# Altium integrated library TI Power Management Battery Management.IntLib: 950 symbols (part 35 of 48)
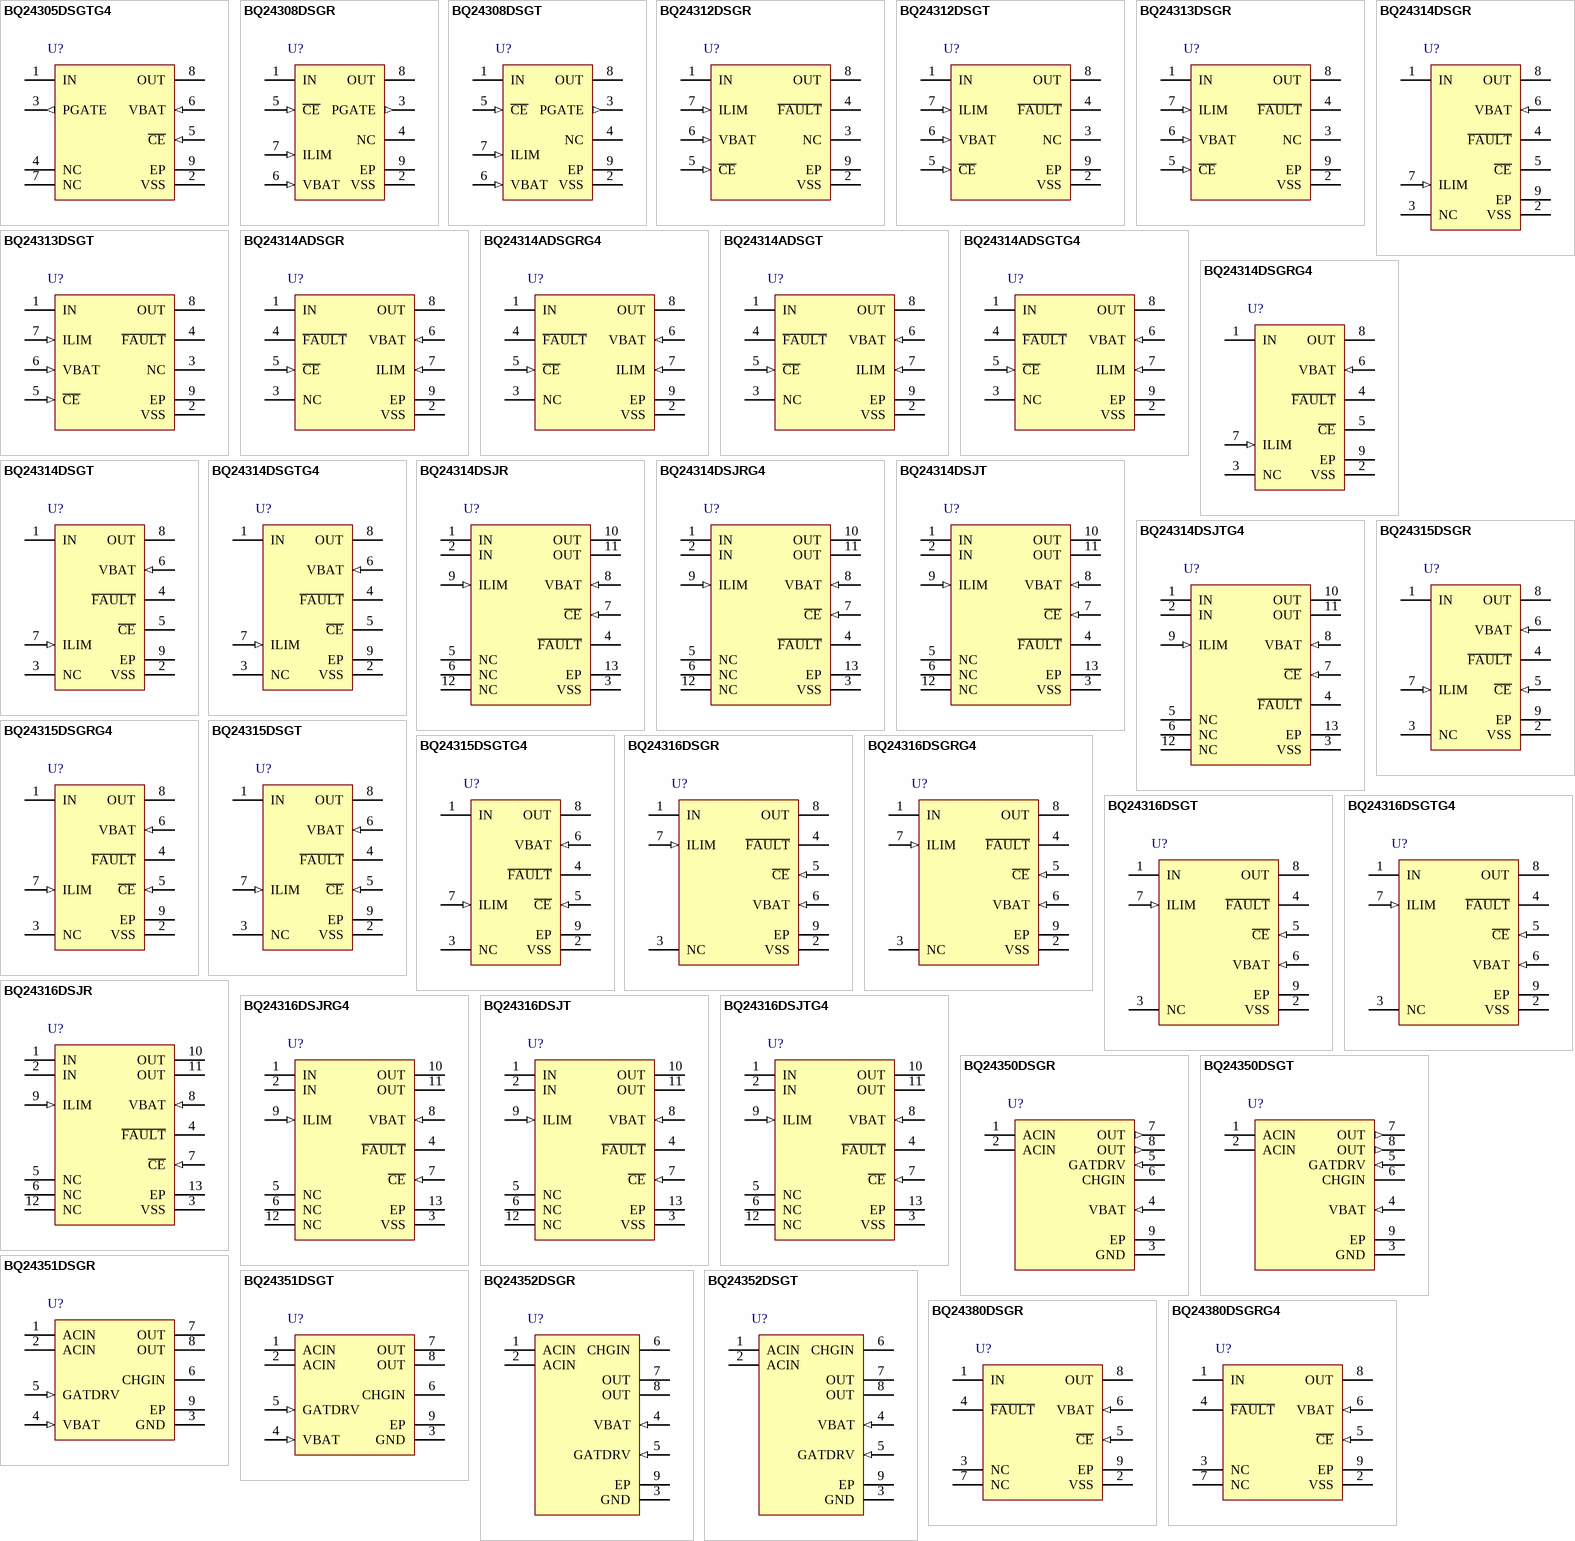
[diagram p68: symbols BQ24305DSGTG4 to BQ24380DSGRG4]

## BQ24316DSJT
designator U?
Charger Front End Protection IC with 30 V Max Vin and 6.8 V OVP, -40 to 85 degC, 12-pin VSON (DSJ), Green (RoHS & no Sb/Br); PartNumber: BQ24316DSJT; Manufacturer: Texas Instruments; Lead Acid: N; DatasheetVersion: SLUS763C; PackageVersion: revC, Jun-2011; PackageReference: DSJ12-3300X1700TP; PackageDescription: 12-Pin Plastic Small Outline No-Lead, 3 x 4 x 1 mm Body, 0.5 mm Pitch, Exposed Pad; Supplier 1: Digi-Key; Supplier Part Number 1: BQ24316DSJT-ND; Supplier Part Number 3: 595-BQ24316DSJT; Eco-Plan: Green (RoHS & no Sb/Br); Li-Ion: N; Li-Polymer: N; NiCd: N; NiMH: N; Over Voltage Protection: N; SubFamily: Charger Front End Protection; Mounting Technology: Surface Mount; Code_JEDEC: MO-229; ComponentLink1Description: Datasheet; ComponentLink1URL: http://www.ti.com/general/docs/lit/getliterature.tsp?genericPartNumber=BQ24316&fileType=pdf
footprint DSJ12-3300X1700TP (SON, 12-Leads, Body 3x4mm, Pitch 0.5mm, Thermal Pad 3.3x1.7mm)
pins: 1 IN (power) "Input power, connect to external DC supply. Connect external 1uF ceramic capacitor (minimum) to VSS. For the 12 pin (DSJ-suffix) device, ensure that pins 1 and 2 are connected together on the PCB at the device.", 2 IN (power) "Input power, connect to external DC supply. Connect external 1uF ceramic capacitor (minimum) to VSS. For the 12 pin (DSJ-suffix) device, ensure that pins 1 and 2 are connected together on the PCB at the device.", 3 VSS (power) "Ground terminal", 4 ~{FAULT} (hiz) "Open-drain output, device status. F\A\U\L\T\ = Low indicates that the input FET Q1 has been turned off due to input overvoltage, input overcurrent, battery overvoltage, or thermal shutdown.", 5 NC "These pins may have internal circuits used for test purposes. Do not make any external connections at these pins for normal operation.", 6 NC "These pins may have internal circuits used for test purposes. Do not make any external connections at these pins for normal operation.", 7 ~{CE} (in) "Chip enable input. Active low. When C\E\ = High, the input FET is off. Internally pulled down.", 8 VBAT (in) "Battery voltage sense input. Connect to pack positive terminal through a resistor.", 9 ILIM (in) "Input overcurrent threshold programming. Connect a resistor to VSS to set the overcurrent threshold.", 10 OUT (power) "Output terminal to the charging system. Connect external 1uF ceramic capacitor (minimum) to VSS.", 11 OUT (power) "Output terminal to the charging system. Connect external 1uF ceramic capacitor (minimum) to VSS.", 12 NC "These pins may have internal circuits used for test purposes. Do not make any external connections at these pins for normal operation.", 13 EP (power) "There is an internal electrical connection between the exposed thermal pad and the VSS pin of the device. The thermal pad must be connected to the same potential as the VSS pin on the printed circuit board. Do not use the (See Datasheet)"

## BQ24316DSJTG4
designator U?
Charger Front End Protection IC with 30 V Max Vin and 6.8 V OVP, -40 to 85 degC, 12-pin VSON (DSJ), Green (RoHS & no Sb/Br); PartNumber: BQ24316DSJTG4; Manufacturer: Texas Instruments; Lead Acid: N; DatasheetVersion: SLUS763C; PackageVersion: revC, Jun-2011; PackageReference: DSJ12-3300X1700TP; PackageDescription: 12-Pin Plastic Small Outline No-Lead, 3 x 4 x 1 mm Body, 0.5 mm Pitch, Exposed Pad; Supplier 1: Digi-Key; Supplier Part Number 1: BQ24316DSJTG4-ND; Eco-Plan: Green (RoHS & no Sb/Br); Li-Ion: N; Li-Polymer: N; NiCd: N; NiMH: N; Over Voltage Protection: N; SubFamily: Charger Front End Protection; Mounting Technology: Surface Mount; Code_JEDEC: MO-229; ComponentLink1Description: Datasheet; ComponentLink1URL: http://www.ti.com/general/docs/lit/getliterature.tsp?genericPartNumber=BQ24316&fileType=pdf
footprint DSJ12-3300X1700TP (SON, 12-Leads, Body 3x4mm, Pitch 0.5mm, Thermal Pad 3.3x1.7mm)
pins: 1 IN (power) "Input power, connect to external DC supply. Connect external 1uF ceramic capacitor (minimum) to VSS. For the 12 pin (DSJ-suffix) device, ensure that pins 1 and 2 are connected together on the PCB at the device.", 2 IN (power) "Input power, connect to external DC supply. Connect external 1uF ceramic capacitor (minimum) to VSS. For the 12 pin (DSJ-suffix) device, ensure that pins 1 and 2 are connected together on the PCB at the device.", 3 VSS (power) "Ground terminal", 4 ~{FAULT} (hiz) "Open-drain output, device status. F\A\U\L\T\ = Low indicates that the input FET Q1 has been turned off due to input overvoltage, input overcurrent, battery overvoltage, or thermal shutdown.", 5 NC "These pins may have internal circuits used for test purposes. Do not make any external connections at these pins for normal operation.", 6 NC "These pins may have internal circuits used for test purposes. Do not make any external connections at these pins for normal operation.", 7 ~{CE} (in) "Chip enable input. Active low. When C\E\ = High, the input FET is off. Internally pulled down.", 8 VBAT (in) "Battery voltage sense input. Connect to pack positive terminal through a resistor.", 9 ILIM (in) "Input overcurrent threshold programming. Connect a resistor to VSS to set the overcurrent threshold.", 10 OUT (power) "Output terminal to the charging system. Connect external 1uF ceramic capacitor (minimum) to VSS.", 11 OUT (power) "Output terminal to the charging system. Connect external 1uF ceramic capacitor (minimum) to VSS.", 12 NC "These pins may have internal circuits used for test purposes. Do not make any external connections at these pins for normal operation.", 13 EP (power) "There is an internal electrical connection between the exposed thermal pad and the VSS pin of the device. The thermal pad must be connected to the same potential as the VSS pin on the printed circuit board. Do not use the (See Datasheet)"

## BQ24350DSGR
designator U?
Over-Voltage and Over-Current Charger Front-End Protection IC with FET, 6.17 Input OVP, -40 to 85 degC, 8-pin WSON (DSG), Green (RoHS & no Sb/Br); PartNumber: BQ24350DSGR; Manufacturer: Texas Instruments; Lead Acid: N; SubFamily: Charger Front End Protection; DatasheetVersion: SLUS943A; PackageVersion: revB, Oct-2010; PackageReference: DSG8-1600X900TP; PackageDescription: 8-Pin Plastic Small Outline No-Lead, 2 x 2 x 0.8 mm Body, 0.5 mm Pitch, Exposed Pad; Supplier 1: Digi-Key; Supplier Part Number 1: 296-24528-2-ND; Supplier Part Number 3: 296-24528-6-ND; Eco-Plan: Green (RoHS & no Sb/Br); Li-Ion: N; Li-Polymer: N; NiCd: N; NiMH: N; Over Voltage Protection: N; Mounting Technology: Surface Mount; Code_JEDEC: MO-229; ComponentLink1Description: Datasheet; ComponentLink1URL: http://www.ti.com/general/docs/lit/getliterature.tsp?genericPartNumber=BQ24350&fileType=pdf
footprint DSG8-1600X900TP (SON, 8-Leads, Body 2x2mm, Pitch 0.5mm, Thermal Pad 1.6x0.9mm, TI Recommended)
pins: 1 ACIN (power) "Power Supply Input, connect to an external DC supply. Connect an external 1uF ceramic capacitor (minimum) to GND.", 2 ACIN (power) "Power Supply Input, connect to an external DC supply. Connect an external 1uF ceramic capacitor (minimum) to GND.", 3 GND (power) "Ground terminal", 4 VBAT (in) "Battery voltage sense input. Connected to pack positive terminal through a resistor. Connected to ground if battery OVP function is not used.", 5 GATDRV (in) "P-FET gate drive input , connected to gate drive pin of the host charger controller", 6 CHGIN (power) "Output power pin for power input of host charger controller. Connect an external ceramic bypass capacitor (1.0uF minimum) to GND.", 7 OUT (out) "Output terminal to the charging system.", 8 OUT (out) "Output terminal to the charging system.", 9 EP (power) "There is an internal electrical connection between the exposed thermal pad and the GND pin of the device. The thermal pad must be connected to the same potential as the GND pin on the printed circuit board. Do not use the (See Datasheet)"

## BQ24350DSGT
designator U?
Over-Voltage and Over-Current Charger Front-End Protection IC with FET, 6.17 Input OVP, -40 to 85 degC, 8-pin WSON (DSG), Green (RoHS & no Sb/Br); PartNumber: BQ24350DSGT; Manufacturer: Texas Instruments; Lead Acid: N; SubFamily: Charger Front End Protection; DatasheetVersion: SLUS943A; PackageVersion: revB, Oct-2010; PackageReference: DSG8-1600X900TP; PackageDescription: 8-Pin Plastic Small Outline No-Lead, 2 x 2 x 0.8 mm Body, 0.5 mm Pitch, Exposed Pad; Supplier 1: Digi-Key; Supplier Part Number 1: BQ24350DSGT-ND; Supplier Part Number 3: 595-BQ24350DSGT; Eco-Plan: Green (RoHS & no Sb/Br); Li-Ion: N; Li-Polymer: N; NiCd: N; NiMH: N; Over Voltage Protection: N; Mounting Technology: Surface Mount; Code_JEDEC: MO-229; ComponentLink1Description: Datasheet; ComponentLink1URL: http://www.ti.com/general/docs/lit/getliterature.tsp?genericPartNumber=BQ24350&fileType=pdf
footprint DSG8-1600X900TP (SON, 8-Leads, Body 2x2mm, Pitch 0.5mm, Thermal Pad 1.6x0.9mm, TI Recommended)
pins: 1 ACIN (power) "Power Supply Input, connect to an external DC supply. Connect an external 1uF ceramic capacitor (minimum) to GND.", 2 ACIN (power) "Power Supply Input, connect to an external DC supply. Connect an external 1uF ceramic capacitor (minimum) to GND.", 3 GND (power) "Ground terminal", 4 VBAT (in) "Battery voltage sense input. Connected to pack positive terminal through a resistor. Connected to ground if battery OVP function is not used.", 5 GATDRV (in) "P-FET gate drive input , connected to gate drive pin of the host charger controller", 6 CHGIN (power) "Output power pin for power input of host charger controller. Connect an external ceramic bypass capacitor (1.0uF minimum) to GND.", 7 OUT (out) "Output terminal to the charging system.", 8 OUT (out) "Output terminal to the charging system.", 9 EP (power) "There is an internal electrical connection between the exposed thermal pad and the GND pin of the device. The thermal pad must be connected to the same potential as the GND pin on the printed circuit board. Do not use the (See Datasheet)"

## BQ24351DSGR
designator U?
Over Voltage and Over-Current Charger Front-End Protection IC with Integrated Charging FET, -40 to 85 degC, 8-pin WSON (DSG), Green (RoHS & no Sb/Br); PartNumber: BQ24351DSGR; Manufacturer: Texas Instruments; Lead Acid: N; Over Voltage Protection: Y; SubFamily: Charger Front End Protection; DatasheetVersion: SLUSA62A; PackageVersion: revB, Oct-2010; PackageReference: DSG8-1600X900TP; PackageDescription: 8-Pin Plastic Small Outline No-Lead, 2 x 2 x 0.8 mm Body, 0.5 mm Pitch, Exposed Pad; Supplier 1: Digi-Key; Supplier Part Number 1: BQ24351DSGR-ND; Eco-Plan: Green (RoHS & no Sb/Br); Li-Ion: N; Li-Polymer: N; NiCd: N; NiMH: N; Mounting Technology: Surface Mount; Code_JEDEC: MO-229; ComponentLink1Description: Datasheet; ComponentLink1URL: http://www.ti.com/general/docs/lit/getliterature.tsp?genericPartNumber=BQ24351&fileType=pdf
footprint DSG8-1600X900TP (SON, 8-Leads, Body 2x2mm, Pitch 0.5mm, Thermal Pad 1.6x0.9mm, TI Recommended)
pins: 1 ACIN (power) "Power Supply Input, connect to an external DC supply. Connect an external 1-uF ceramic capacitor (minimum) to GND.", 2 ACIN (power) "Power Supply Input, connect to an external DC supply. Connect an external 1-uF ceramic capacitor (minimum) to GND.", 3 GND (power) "Ground terminal", 4 VBAT (in) "Battery voltage sense input. Connected to pack positive terminal through a resistor. Connected to ground if battery OVP function is not used.", 5 GATDRV (in) "P-FET gate drive input , connected to gate drive pin of the host charger controller", 6 CHGIN (power) "Output power pin for power input of host charger controller. Connect an external ceramic bypass capacitor (1.0-uF minimum) to GND.", 7 OUT (power) "Output terminal to the charging system.", 8 OUT (power) "Output terminal to the charging system.", 9 EP (power) "There is an internal electrical connection between the exposed thermal pad and the GND pin of the device. The thermal pad must be connected to the same potential as the GND pin on the printed circuit board. Do not use the (See Datasheet)"

## BQ24351DSGT
designator U?
Over-Voltage and Over-Current Charger Front-End Protection IC with Integrated Charging FET, -40 to 85 degC, 8-pin WSON (DSG), Green (RoHS & no Sb/Br); PartNumber: BQ24351DSGT; Manufacturer: Texas Instruments; Lead Acid: N; Over Voltage Protection: Y; SubFamily: Charger Front End Protection; DatasheetVersion: SLUSA62A; PackageVersion: revB, Oct-2010; PackageReference: DSG8-1600X900TP; PackageDescription: 8-Pin Plastic Small Outline No-Lead, 2 x 2 x 0.8 mm Body, 0.5 mm Pitch, Exposed Pad; Supplier 1: Digi-Key; Supplier Part Number 1: 296-27913-2-ND; Supplier Part Number 3: 296-27913-6-ND; Eco-Plan: Green (RoHS & no Sb/Br); Li-Ion: N; Li-Polymer: N; NiCd: N; NiMH: N; Mounting Technology: Surface Mount; Code_JEDEC: MO-229; ComponentLink1Description: Datasheet; ComponentLink1URL: http://www.ti.com/general/docs/lit/getliterature.tsp?genericPartNumber=BQ24351&fileType=pdf
footprint DSG8-1600X900TP (SON, 8-Leads, Body 2x2mm, Pitch 0.5mm, Thermal Pad 1.6x0.9mm, TI Recommended)
pins: 1 ACIN (power) "Power Supply Input, connect to an external DC supply. Connect an external 1-uF ceramic capacitor (minimum) to GND.", 2 ACIN (power) "Power Supply Input, connect to an external DC supply. Connect an external 1-uF ceramic capacitor (minimum) to GND.", 3 GND (power) "Ground terminal", 4 VBAT (in) "Battery voltage sense input. Connected to pack positive terminal through a resistor. Connected to ground if battery OVP function is not used.", 5 GATDRV (in) "P-FET gate drive input , connected to gate drive pin of the host charger controller", 6 CHGIN (power) "Output power pin for power input of host charger controller. Connect an external ceramic bypass capacitor (1.0-uF minimum) to GND.", 7 OUT (power) "Output terminal to the charging system.", 8 OUT (power) "Output terminal to the charging system.", 9 EP (power) "There is an internal electrical connection between the exposed thermal pad and the GND pin of the device. The thermal pad must be connected to the same potential as the GND pin on the printed circuit board. Do not use the (See Datasheet)"

## BQ24352DSGR
designator U?
Over Voltage and Over-Current Charger Front-End Protection IC with FET, 7.1 Input OVP, -40 to 85 degC, 8-pin WSON (DSG), Green (RoHS & no Sb/Br); PartNumber: BQ24352DSGR; Manufacturer: Texas Instruments; Lead Acid: N; SubFamily: Charger Front End Protection; DatasheetVersion: SLUS943A; PackageVersion: revB, Oct-2010; PackageReference: DSG8-1600X900TP; PackageDescription: 8-Pin Plastic Small Outline No-Lead, 2 x 2 x 0.8 mm Body, 0.5 mm Pitch, Exposed Pad; Supplier 1: Digi-Key; Supplier Part Number 1: 296-24859-2-ND; Supplier Part Number 3: 296-24859-6-ND; Eco-Plan: Green (RoHS & no Sb/Br); Li-Ion: N; Li-Polymer: N; NiCd: N; NiMH: N; Over Voltage Protection: N; Mounting Technology: Surface Mount; Code_JEDEC: MO-229; ComponentLink1Description: Datasheet; ComponentLink1URL: http://www.ti.com/general/docs/lit/getliterature.tsp?genericPartNumber=BQ24352&fileType=pdf
footprint DSG8-1600X900TP (SON, 8-Leads, Body 2x2mm, Pitch 0.5mm, Thermal Pad 1.6x0.9mm, TI Recommended)
pins: 1 ACIN (power) "Power Supply Input, connect to an external DC supply. Connect an external 1 uF ceramic capacitor (minimum) to GND.", 2 ACIN (power) "Power Supply Input, connect to an external DC supply. Connect an external 1 uF ceramic capacitor (minimum) to GND.", 3 GND (power) "Ground terminal.", 4 VBAT (in) "Battery voltage sense input. Connected to pack positive terminal through a resistor. Connected to ground if battery OVP function is not used.", 5 GATDRV (in) "P-FET gate drive input , connected to gate drive pin of the host charger controller.", 6 CHGIN (power) "Output power pin for power input of host charger controller. Connect an external ceramic bypass capacitor (1.0 uF minimum) to GND.", 7 OUT (power) "Output terminal to the charging system.", 8 OUT (power) "Output terminal to the charging system.", 9 EP (power) "There is an internal electrical connection between the exposed thermal pad and the GND pin of the device. The thermal pad must be connected to the same potential as the GND pin on the printed circuit board. Do not use the (See Datasheet)"

## BQ24352DSGT
designator U?
Over Voltage and Over-Current Charger Front-End Protection IC with FET, 7.1 Input OVP, -40 to 85 degC, 8-pin WSON (DSG), Green (RoHS & no Sb/Br); PartNumber: BQ24352DSGT; Manufacturer: Texas Instruments; Lead Acid: N; SubFamily: Charger Front End Protection; DatasheetVersion: SLUS943A; PackageVersion: revB, Oct-2010; PackageReference: DSG8-1600X900TP; PackageDescription: 8-Pin Plastic Small Outline No-Lead, 2 x 2 x 0.8 mm Body, 0.5 mm Pitch, Exposed Pad; Supplier 1: Digi-Key; Supplier Part Number 1: BQ24352DSGT-ND; Eco-Plan: Green (RoHS & no Sb/Br); Li-Ion: N; Li-Polymer: N; NiCd: N; NiMH: N; Over Voltage Protection: N; Mounting Technology: Surface Mount; Code_JEDEC: MO-229; ComponentLink1Description: Datasheet; ComponentLink1URL: http://www.ti.com/general/docs/lit/getliterature.tsp?genericPartNumber=BQ24352&fileType=pdf
footprint DSG8-1600X900TP (SON, 8-Leads, Body 2x2mm, Pitch 0.5mm, Thermal Pad 1.6x0.9mm, TI Recommended)
pins: 1 ACIN (power) "Power Supply Input, connect to an external DC supply. Connect an external 1 uF ceramic capacitor (minimum) to GND.", 2 ACIN (power) "Power Supply Input, connect to an external DC supply. Connect an external 1 uF ceramic capacitor (minimum) to GND.", 3 GND (power) "Ground terminal.", 4 VBAT (in) "Battery voltage sense input. Connected to pack positive terminal through a resistor. Connected to ground if battery OVP function is not used.", 5 GATDRV (in) "P-FET gate drive input , connected to gate drive pin of the host charger controller.", 6 CHGIN (power) "Output power pin for power input of host charger controller. Connect an external ceramic bypass capacitor (1.0 uF minimum) to GND.", 7 OUT (power) "Output terminal to the charging system.", 8 OUT (power) "Output terminal to the charging system.", 9 EP (power) "There is an internal electrical connection between the exposed thermal pad and the GND pin of the device. The thermal pad must be connected to the same potential as the GND pin on the printed circuit board. Do not use the (See Datasheet)"

## BQ24380DSGR
designator U?
Overvoltage / Overcurrent Protection IC and Li+ Charger Front End Protection IC with LDO Mode, 6.3 OVP, -40 to 125 degC, 8-pin WSON (DSG), Green (RoHS & no Sb/Br); PartNumber: BQ24380DSGR; Manufacturer: Texas Instruments; Lead Acid: N; DatasheetVersion: SLUS805B; PackageVersion: revB, Oct-2010; PackageReference: DSG8-1600X900TP; PackageDescription: 8-Pin Plastic Small Outline No-Lead, 2 x 2 x 0.8 mm Body, 0.5 mm Pitch, Exposed Pad; Supplier 1: Digi-Key; Supplier Part Number 1: 296-23385-2-ND; Supplier Part Number 3: 296-23385-6-ND; Eco-Plan: Green (RoHS & no Sb/Br); Li-Ion: N; Li-Polymer: N; NiCd: N; NiMH: N; Over Voltage Protection: N; SubFamily: Charger Front End Protection; Mounting Technology: Surface Mount; Code_JEDEC: MO-229; ComponentLink1Description: Datasheet; ComponentLink1URL: http://www.ti.com/general/docs/lit/getliterature.tsp?genericPartNumber=BQ24380&fileType=pdf
footprint DSG8-1600X900TP (SON, 8-Leads, Body 2x2mm, Pitch 0.5mm, Thermal Pad 1.6x0.9mm, TI Recommended)
pins: 1 IN (power) "Input power, connected to external DC supply. Bypass IN to VSS with a ceramic capacitor (1 uF minimum)", 2 VSS (power) "Ground terminal. Connect to the thermal pad and to the ground rail of the circuit", 3 NC "Do not connect to any external circuits. These pins may have internal connections used for test purposes.", 4 ~{FAULT} (hiz) "Open-drain device status output. F\A\U\L\T\ is pulled to VSS internally when the input pass FET has been turned off due to input overvoltage or output short-circuit conditions, an overtemperature condition, or because the (See Datasheet)", 5 ~{CE} (in) "Active-low chip enable input. Connect C\E\ = HI to turn the input pass FET off. Connect C\E\ = LOW to turn the internal pass FET on and connect the input to the charging circuitry. C\E\ is Internally pulled down, ~200 k ohm.", 6 VBAT (in) "Battery voltage sense input. Connected to pack positive terminal through a 100-k ohm resistor", 7 NC "Do not connect to any external circuits. These pins may have internal connections used for test purposes.", 8 OUT (power) "Output terminal to the charging system. Bypass OUT to VSS with a ceramic capacitor (1 uF minimum)", 9 EP (power) "The thermal pad is electrically connected to VSS internally. The thermal pad must be connected to the same potential as the VSS pin on the printed circuit board. Do not use the thermal pad as the primary ground input for the (See Datasheet)"

## BQ24380DSGRG4
designator U?
Overvoltage / Overcurrent Protection IC and Li+ Charger Front End Protection IC with LDO Mode, 6.3 OVP, -40 to 125 degC, 8-pin WSON (DSG), Green (RoHS & no Sb/Br); PartNumber: BQ24380DSGRG4; Manufacturer: Texas Instruments; Lead Acid: N; DatasheetVersion: SLUS805B; PackageVersion: revB, Oct-2010; PackageReference: DSG8-1600X900TP; PackageDescription: 8-Pin Plastic Small Outline No-Lead, 2 x 2 x 0.8 mm Body, 0.5 mm Pitch, Exposed Pad; Supplier 1: Digi-Key; Supplier Part Number 1: BQ24380DSGRG4-ND; Eco-Plan: Green (RoHS & no Sb/Br); Li-Ion: N; Li-Polymer: N; NiCd: N; NiMH: N; Over Voltage Protection: N; SubFamily: Charger Front End Protection; Mounting Technology: Surface Mount; Code_JEDEC: MO-229; ComponentLink1Description: Datasheet; ComponentLink1URL: http://www.ti.com/general/docs/lit/getliterature.tsp?genericPartNumber=BQ24380&fileType=pdf
footprint DSG8-1600X900TP (SON, 8-Leads, Body 2x2mm, Pitch 0.5mm, Thermal Pad 1.6x0.9mm, TI Recommended)
pins: 1 IN (power) "Input power, connected to external DC supply. Bypass IN to VSS with a ceramic capacitor (1 uF minimum)", 2 VSS (power) "Ground terminal. Connect to the thermal pad and to the ground rail of the circuit", 3 NC "Do not connect to any external circuits. These pins may have internal connections used for test purposes.", 4 ~{FAULT} (hiz) "Open-drain device status output. F\A\U\L\T\ is pulled to VSS internally when the input pass FET has been turned off due to input overvoltage or output short-circuit conditions, an overtemperature condition, or because the (See Datasheet)", 5 ~{CE} (in) "Active-low chip enable input. Connect C\E\ = HI to turn the input pass FET off. Connect C\E\ = LOW to turn the internal pass FET on and connect the input to the charging circuitry. C\E\ is Internally pulled down, ~200 k ohm.", 6 VBAT (in) "Battery voltage sense input. Connected to pack positive terminal through a 100-k ohm resistor", 7 NC "Do not connect to any external circuits. These pins may have internal connections used for test purposes.", 8 OUT (power) "Output terminal to the charging system. Bypass OUT to VSS with a ceramic capacitor (1 uF minimum)", 9 EP (power) "The thermal pad is electrically connected to VSS internally. The thermal pad must be connected to the same potential as the VSS pin on the printed circuit board. Do not use the thermal pad as the primary ground input for the (See Datasheet)"

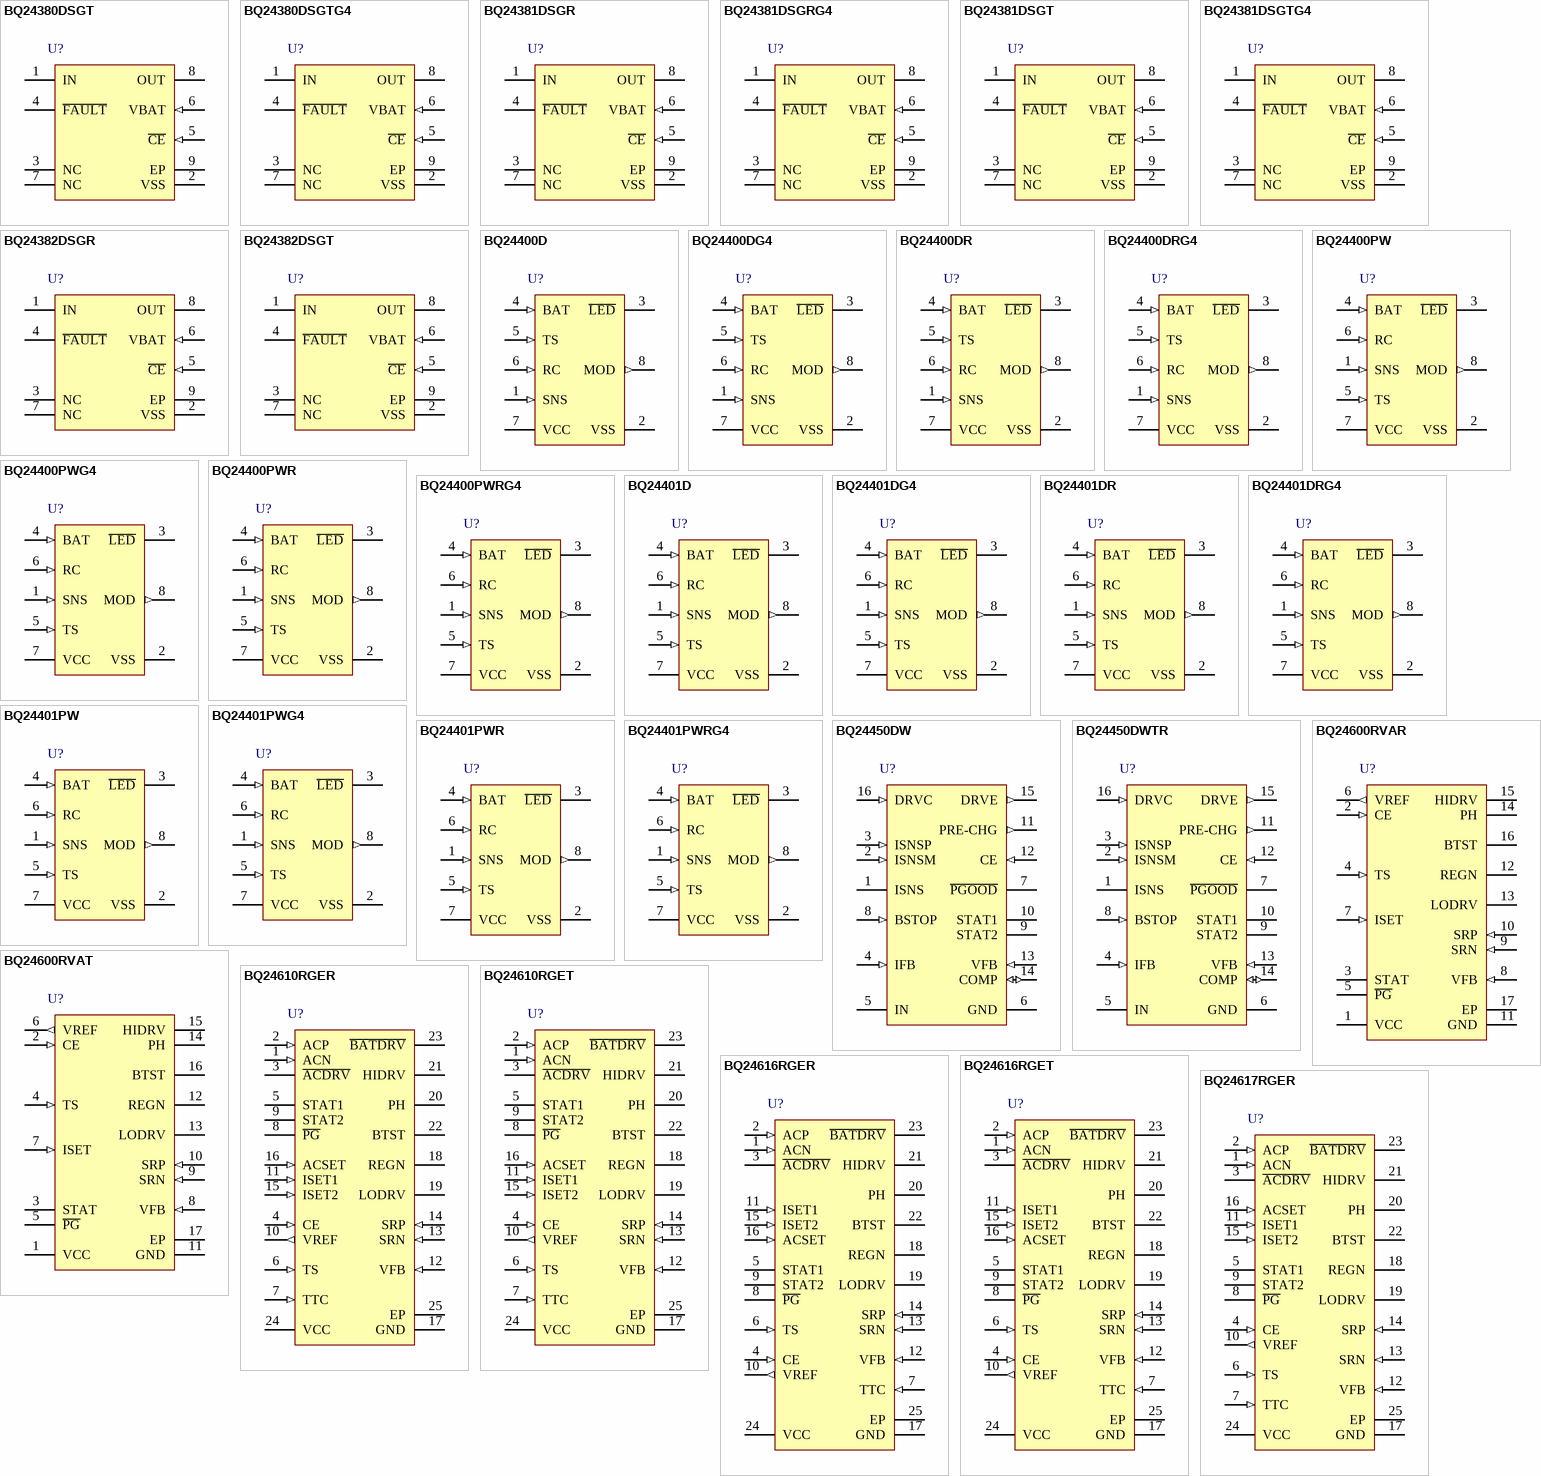
[diagram p24: symbols BQ24380DSGT to BQ24617RGER]

## BQ24380DSGT
designator U?
Overvoltage / Overcurrent Protection IC and Li+ Charger Front End Protection IC with LDO Mode, 6.3 OVP, -40 to 125 degC, 8-pin WSON (DSG), Green (RoHS & no Sb/Br); PartNumber: BQ24380DSGT; Manufacturer: Texas Instruments; Lead Acid: N; DatasheetVersion: SLUS805B; PackageVersion: revB, Oct-2010; PackageReference: DSG8-1600X900TP; PackageDescription: 8-Pin Plastic Small Outline No-Lead, 2 x 2 x 0.8 mm Body, 0.5 mm Pitch, Exposed Pad; Supplier 1: Digi-Key; Supplier Part Number 1: BQ24380DSGT-ND; Eco-Plan: Green (RoHS & no Sb/Br); Li-Ion: N; Li-Polymer: N; NiCd: N; NiMH: N; Over Voltage Protection: N; SubFamily: Charger Front End Protection; Mounting Technology: Surface Mount; Code_JEDEC: MO-229; ComponentLink1Description: Datasheet; ComponentLink1URL: http://www.ti.com/general/docs/lit/getliterature.tsp?genericPartNumber=BQ24380&fileType=pdf
footprint DSG8-1600X900TP (SON, 8-Leads, Body 2x2mm, Pitch 0.5mm, Thermal Pad 1.6x0.9mm, TI Recommended)
pins: 1 IN (power) "Input power, connected to external DC supply. Bypass IN to VSS with a ceramic capacitor (1 uF minimum)", 2 VSS (power) "Ground terminal. Connect to the thermal pad and to the ground rail of the circuit", 3 NC "Do not connect to any external circuits. These pins may have internal connections used for test purposes.", 4 ~{FAULT} (hiz) "Open-drain device status output. F\A\U\L\T\ is pulled to VSS internally when the input pass FET has been turned off due to input overvoltage or output short-circuit conditions, an overtemperature condition, or because the (See Datasheet)", 5 ~{CE} (in) "Active-low chip enable input. Connect C\E\ = HI to turn the input pass FET off. Connect C\E\ = LOW to turn the internal pass FET on and connect the input to the charging circuitry. C\E\ is Internally pulled down, ~200 k ohm.", 6 VBAT (in) "Battery voltage sense input. Connected to pack positive terminal through a 100-k ohm resistor", 7 NC "Do not connect to any external circuits. These pins may have internal connections used for test purposes.", 8 OUT (power) "Output terminal to the charging system. Bypass OUT to VSS with a ceramic capacitor (1 uF minimum)", 9 EP (power) "The thermal pad is electrically connected to VSS internally. The thermal pad must be connected to the same potential as the VSS pin on the printed circuit board. Do not use the thermal pad as the primary ground input for the (See Datasheet)"

## BQ24380DSGTG4
designator U?
Overvoltage / Overcurrent Protection IC and Li+ Charger Front End Protection IC with LDO Mode, 6.3 OVP, -40 to 125 degC, 8-pin WSON (DSG), Green (RoHS & no Sb/Br); PartNumber: BQ24380DSGTG4; Manufacturer: Texas Instruments; Lead Acid: N; DatasheetVersion: SLUS805B; PackageVersion: revB, Oct-2010; PackageReference: DSG8-1600X900TP; PackageDescription: 8-Pin Plastic Small Outline No-Lead, 2 x 2 x 0.8 mm Body, 0.5 mm Pitch, Exposed Pad; Supplier 1: Digi-Key; Supplier Part Number 1: BQ24380DSGTG4-ND; Eco-Plan: Green (RoHS & no Sb/Br); Li-Ion: N; Li-Polymer: N; NiCd: N; NiMH: N; Over Voltage Protection: N; SubFamily: Charger Front End Protection; Mounting Technology: Surface Mount; Code_JEDEC: MO-229; ComponentLink1Description: Datasheet; ComponentLink1URL: http://www.ti.com/general/docs/lit/getliterature.tsp?genericPartNumber=BQ24380&fileType=pdf
footprint DSG8-1600X900TP (SON, 8-Leads, Body 2x2mm, Pitch 0.5mm, Thermal Pad 1.6x0.9mm, TI Recommended)
pins: 1 IN (power) "Input power, connected to external DC supply. Bypass IN to VSS with a ceramic capacitor (1 uF minimum)", 2 VSS (power) "Ground terminal. Connect to the thermal pad and to the ground rail of the circuit", 3 NC "Do not connect to any external circuits. These pins may have internal connections used for test purposes.", 4 ~{FAULT} (hiz) "Open-drain device status output. F\A\U\L\T\ is pulled to VSS internally when the input pass FET has been turned off due to input overvoltage or output short-circuit conditions, an overtemperature condition, or because the (See Datasheet)", 5 ~{CE} (in) "Active-low chip enable input. Connect C\E\ = HI to turn the input pass FET off. Connect C\E\ = LOW to turn the internal pass FET on and connect the input to the charging circuitry. C\E\ is Internally pulled down, ~200 k ohm.", 6 VBAT (in) "Battery voltage sense input. Connected to pack positive terminal through a 100-k ohm resistor", 7 NC "Do not connect to any external circuits. These pins may have internal connections used for test purposes.", 8 OUT (power) "Output terminal to the charging system. Bypass OUT to VSS with a ceramic capacitor (1 uF minimum)", 9 EP (power) "The thermal pad is electrically connected to VSS internally. The thermal pad must be connected to the same potential as the VSS pin on the printed circuit board. Do not use the thermal pad as the primary ground input for the (See Datasheet)"
